# Altium schematic symbol library TI Amplifiers and Linear Special Function Amplifier.SchLib: 708 symbols (part 32 of 34) (continued)
## TPA6101A2DGKRG4
designator U?
50-mW Ultra Low-Voltage, Stereo Headphone Audio Amplifier with Fixed Gain (2 dB), -40 to 85 degC, 8-pin SOP (DGK8), Green (RoHS & no Sb/Br); Manufacturer: Texas Instruments; PartNumber: TPA6101A2DGKRG4; Half Power THD + N @ 1 kHz (%)(kHz): 0.1; ISD(uA): 0.05; Load(Min)(ohms): 16; PSRR(dB): 72; SubFamily: Headphone Amplifier; Supply Max(Max)(Volt): 3.6; Supply Min(Min)(Volt): 1.6; DatasheetVersion: SLOS331C; PackageVersion: 4073329/E, 05/2006; PackageReference: DGK8; PackageDescription: 8-Pin Thin Small Outline, Body 3 x 3 mm, Pitch 0.65 mm; Supplier 1: Digi-Key; Supplier Part Number 1: TPA6101A2DGKRG4-ND; Supplier 2: Mouser; Supplier Part Number 2: 595-TPA6101A2DGKRG4; Eco-Plan: Green (RoHS & no Sb/Br); Headphone Channels: Stereo; Output Power(W): 0.05; Special Features: Fixed Gain; Mounting Technology: Surface Mount; Code_JEDEC: MO-187; ComponentLink1Description: Manufacturer URL; ComponentLink1URL: http://www.ti.com/; ComponentLink2Description: Datasheet; ComponentLink2URL: http://www.ti.com/general/docs/lit/getliterature.tsp?genericPartNumber=TPA6101A2&fileType=pdf; ComponentLink3Description: Package Specification; ComponentLink3URL: http://www.ti.com/litv/pdf/mpds028d
footprint TI-DGK8_N (SOP, 8-Leads, Body 3.1x3.1mm, Pitch 0.65mm, IPC Medium Density)
footprint TI-DGK8_L (SOP, 8-Leads, Body 3.1x3.1mm, Pitch 0.65mm, IPC High Density)
footprint TI-DGK8_M (SOP, 8-Leads, Body 3.1x3.1mm, Pitch 0.65mm, IPC Low Density)
pins: 1 BYPASS "Tap to voltage divider for internal mid-supply bias supply. BYPASS is set at VDD/4. Connect to a 0.1-uF to 1-uF low ESR capacitor for best performance.", 2 GND (power) "GND is the ground connection.", 3 ~{SHUTDOWN} (in) "Active-low input. When held low, the device is placed in a low supply current mode.", 4 IN2- (in) "IN2- is the inverting input for channel 2.", 5 VO2 (out) "VO2 is the audio output for channel 2.", 6 VDD (power) "VDD is the supply voltage terminal.", 7 VO1 (out) "VO1 is the audio output for channel 1.", 8 IN1- (in) "IN1- is the inverting input for channel 1."

## TPA6101A2ZQYR
designator U?
50-mW Ultra Low-Voltage, Stereo Headphone Audio Amplifier with Fixed Gain (2 dB), -40 to 85 degC, 15-pin BGA (ZQY15), Green (RoHS & no Sb/Br); Manufacturer: Texas Instruments; PartNumber: TPA6101A2ZQYR; Half Power THD + N @ 1 kHz (%)(kHz): 0.1; ISD(uA): 0.05; Load(Min)(ohms): 16; PSRR(dB): 72; SubFamily: Headphone Amplifier; Supply Max(Max)(Volt): 3.6; Supply Min(Min)(Volt): 1.6; DatasheetVersion: SLOS331C; PackageVersion: 4205130/A, 05/2003; PackageReference: ZQY15; PackageDescription: 15-Ball Plastic Grid Array, Body 2.5 x 2.5 mm, Pitch 0.5 mm; Supplier 1: Digi-Key; Supplier Part Number 1: 296-21674-2-ND; Supplier 2: Digi-Key; Supplier Part Number 2: 296-21674-1-ND; Supplier 3: Mouser; Supplier Part Number 3: 595-TPA6101A2ZQYR; Eco-Plan: Green (RoHS & no Sb/Br); Headphone Channels: Stereo; Output Power(W): 0.05; Special Features: Fixed Gain; Mounting Technology: Surface Mount; Code_JEDEC: MO-225; ComponentLink1Description: Manufacturer URL; ComponentLink1URL: http://www.ti.com/; ComponentLink2Description: Datasheet; ComponentLink2URL: http://www.ti.com/general/docs/lit/getliterature.tsp?genericPartNumber=TPA6101A2&fileType=pdf; ComponentLink3Description: Package Specification; ComponentLink3URL: http://www.ti.com/litv/pdf/mpbg361
footprint TI-ZQY15 (BGA, 15-Balls, Body 2.5x2.5mm, Pitch 0.5mm)
part A pins: A1 BYPASS "Tap to voltage divider for internal mid-supply bias supply. BYPASS is set at VDD/4. Connect to a 0.1-uF to 1-uF low-ESR capacitor for best performance.", A4 IN1- (in) "IN1- is the inverting input for channel 1.", B4 VO1 (out) "VO1 is the audio output for channel 1.", C1 ~{SHUTDOWN} (in) "Active-low input. When held low, the device is placed in a low-supply-current mode.", D1 IN2- (in) "IN2- is the inverting input for channel 2.", D4 VO2 (out) "VO2 is the audio output for channel 2."
part B pins: A2 GND (power) "GND is the ground connection.", A3 GND (power) "GND is the ground connection.", B1 GND (power) "GND is the ground connection.", B3 GND (power) "GND is the ground connection.", C2 GND (power) "GND is the ground connection.", C3 GND (power) "GND is the ground connection.", C4 VDD (power) "VDD is the supply voltage terminal.", D2 GND (power) "GND is the ground connection.", D3 GND (power) "GND is the ground connection."

## TPA6101A2ZQYRG1
designator U?
50-mW Ultra Low-Voltage, Stereo Headphone Audio Amplifier with Fixed Gain (2 dB), -40 to 85 degC, 15-pin BGA (ZQY15), Green (RoHS & no Sb/Br); Manufacturer: Texas Instruments; PartNumber: TPA6101A2ZQYRG1; Half Power THD + N @ 1 kHz (%)(kHz): 0.1; ISD(uA): 0.05; Load(Min)(ohms): 16; PSRR(dB): 72; SubFamily: Headphone Amplifier; Supply Max(Max)(Volt): 3.6; Supply Min(Min)(Volt): 1.6; DatasheetVersion: SLOS331C; PackageVersion: 4205130/A, 05/2003; PackageReference: ZQY15; PackageDescription: 15-Ball Plastic Grid Array, Body 2.5 x 2.5 mm, Pitch 0.5 mm; Supplier 1: Digi-Key; Supplier Part Number 1: TPA6101A2ZQYRG1-ND; Supplier 2: Mouser; Supplier Part Number 2: 595-TPA6101A2ZQYRG1; Eco-Plan: Green (RoHS & no Sb/Br); Headphone Channels: Stereo; Output Power(W): 0.05; Special Features: Fixed Gain; Mounting Technology: Surface Mount; Code_JEDEC: MO-225; ComponentLink1Description: Manufacturer URL; ComponentLink1URL: http://www.ti.com/; ComponentLink2Description: Datasheet; ComponentLink2URL: http://www.ti.com/general/docs/lit/getliterature.tsp?genericPartNumber=TPA6101A2&fileType=pdf; ComponentLink3Description: Package Specification; ComponentLink3URL: http://www.ti.com/litv/pdf/mpbg361
footprint TI-ZQY15 (BGA, 15-Balls, Body 2.5x2.5mm, Pitch 0.5mm)
part A pins: A1 BYPASS "Tap to voltage divider for internal mid-supply bias supply. BYPASS is set at VDD/4. Connect to a 0.1-uF to 1-uF low-ESR capacitor for best performance.", A4 IN1- (in) "IN1- is the inverting input for channel 1.", B4 VO1 (out) "VO1 is the audio output for channel 1.", C1 ~{SHUTDOWN} (in) "Active-low input. When held low, the device is placed in a low-supply-current mode.", D1 IN2- (in) "IN2- is the inverting input for channel 2.", D4 VO2 (out) "VO2 is the audio output for channel 2."
part B pins: A2 GND (power) "GND is the ground connection.", A3 GND (power) "GND is the ground connection.", B1 GND (power) "GND is the ground connection.", B3 GND (power) "GND is the ground connection.", C2 GND (power) "GND is the ground connection.", C3 GND (power) "GND is the ground connection.", C4 VDD (power) "VDD is the supply voltage terminal.", D2 GND (power) "GND is the ground connection.", D3 GND (power) "GND is the ground connection."

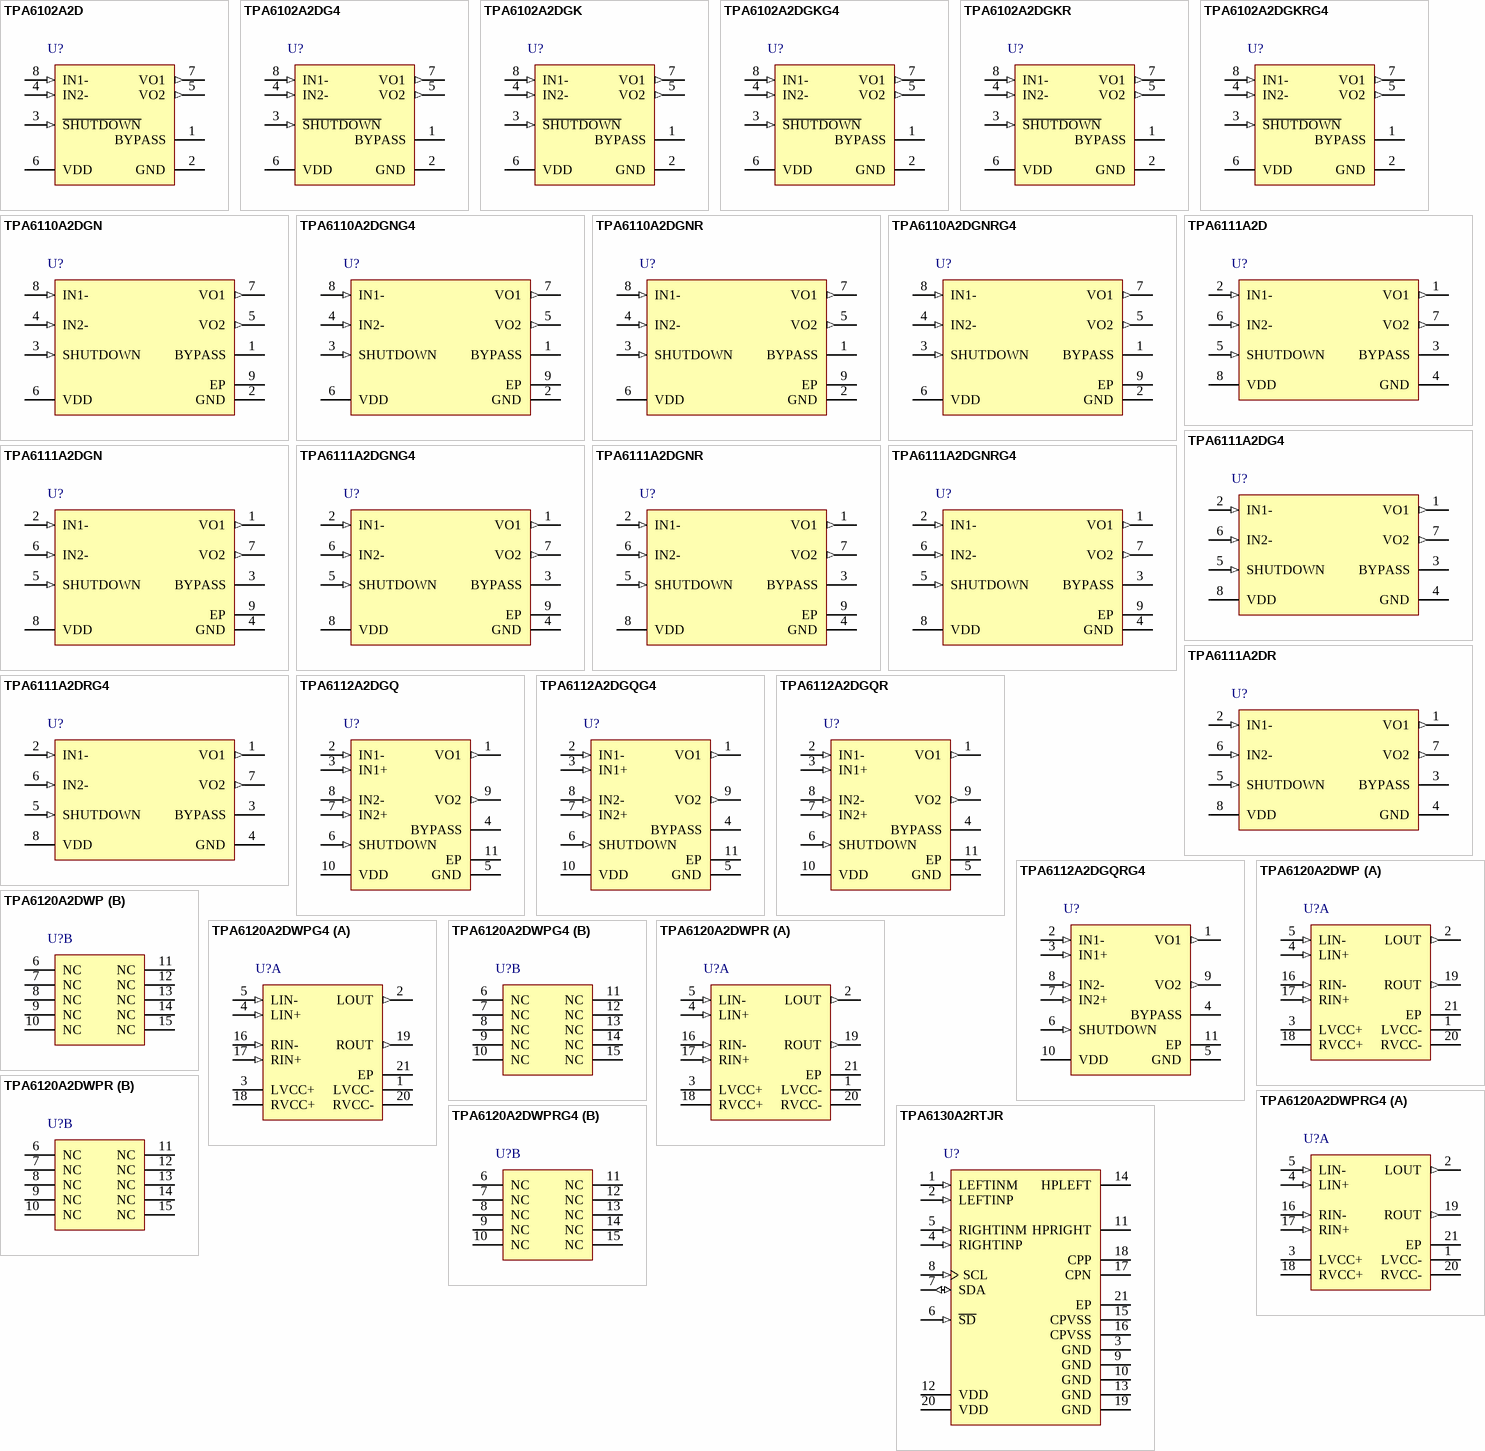
[diagram p37: symbols TPA6102A2D to TPA6130A2RTJR]

## TPA6102A2D
designator U?
50-mW Ultra Low-Voltage, Stereo Headphone Audio Amplifier with Fixed Gain (14 dB), -40 to 85 degC, 8-pin SOIC (D8), Green (RoHS & no Sb/Br); Manufacturer: Texas Instruments; PartNumber: TPA6102A2D; ISD(uA): 0.05; Load(Min)(ohms): 16; PSRR(dB): 72; SubFamily: Headphone Amplifier; Supply Max(Max)(Volt): 3.6; Supply Min(Min)(Volt): 1.6; DatasheetVersion: SLOS324B; PackageVersion: 4040047-3/M, 06/2011; PackageReference: D8; PackageDescription: 8-Pin Plastic Small Outline, Body 4.9 x 3.9 mm, Pitch 1.27 mm; Supplier 1: Digi-Key; Supplier Part Number 1: 296-7020-5-ND; Supplier 2: Mouser; Supplier Part Number 2: 595-TPA6102A2D; Eco-Plan: Green (RoHS & no Sb/Br); Headphone Channels: Stereo; Output Power(W): 0.05; Mounting Technology: Surface Mount; Code_JEDEC: MS-012; ComponentLink1Description: Manufacturer URL; ComponentLink1URL: http://www.ti.com/; ComponentLink2Description: Datasheet; ComponentLink2URL: http://www.ti.com/general/docs/lit/getliterature.tsp?genericPartNumber=TPA6102A2&fileType=pdf; ComponentLink3Description: Package Specification; ComponentLink3URL: http://www.ti.com/litv/pdf/msoi002j
footprint TI-D8_N (SOIC, 8-Leads, Body 5x4mm, Pitch 1.27mm, IPC Medium Density)
footprint TI-D8_L (SOIC, 8-Leads, Body 5x4mm, Pitch 1.27mm, IPC High Density)
footprint TI-D8_M (SOIC, 8-Leads, Body 5x4mm, Pitch 1.27mm, IPC Low Density)
pins: 1 BYPASS "Tap to voltage divider for internal mid-supply bias supply. BYPASS is set at VDD/4. Connect to a 0.1-uF to 1-uF low ESR capacitor for best performance.", 2 GND (power) "GND is the ground connection.", 3 ~{SHUTDOWN} (in) "Active-low input. When held low, the device is placed in a low supply current mode.", 4 IN2- (in) "IN2- is the inverting input for channel 2.", 5 VO2 (out) "VO2 is the audio output for channel 2.", 6 VDD (power) "VDD is the supply voltage terminal.", 7 VO1 (out) "VO1 is the audio output for channel 1.", 8 IN1- (in) "IN1- is the inverting input for channel 1."

## TPA6102A2DG4
designator U?
50-mW Ultra Low-Voltage, Stereo Headphone Audio Amplifier with Fixed Gain (14 dB), -40 to 85 degC, 8-pin SOIC (D8), Green (RoHS & no Sb/Br); Manufacturer: Texas Instruments; PartNumber: TPA6102A2DG4; ISD(uA): 0.05; Load(Min)(ohms): 16; PSRR(dB): 72; SubFamily: Headphone Amplifier; Supply Max(Max)(Volt): 3.6; Supply Min(Min)(Volt): 1.6; DatasheetVersion: SLOS324B; PackageVersion: 4040047-3/M, 06/2011; PackageReference: D8; PackageDescription: 8-Pin Plastic Small Outline, Body 4.9 x 3.9 mm, Pitch 1.27 mm; Supplier 1: Digi-Key; Supplier Part Number 1: TPA6102A2DG4-ND; Supplier 2: Mouser; Supplier Part Number 2: 595-TPA6102A2DG4; Eco-Plan: Green (RoHS & no Sb/Br); Headphone Channels: Stereo; Output Power(W): 0.05; Mounting Technology: Surface Mount; Code_JEDEC: MS-012; ComponentLink1Description: Manufacturer URL; ComponentLink1URL: http://www.ti.com/; ComponentLink2Description: Datasheet; ComponentLink2URL: http://www.ti.com/general/docs/lit/getliterature.tsp?genericPartNumber=TPA6102A2&fileType=pdf; ComponentLink3Description: Package Specification; ComponentLink3URL: http://www.ti.com/litv/pdf/msoi002j
footprint TI-D8_N (SOIC, 8-Leads, Body 5x4mm, Pitch 1.27mm, IPC Medium Density)
footprint TI-D8_L (SOIC, 8-Leads, Body 5x4mm, Pitch 1.27mm, IPC High Density)
footprint TI-D8_M (SOIC, 8-Leads, Body 5x4mm, Pitch 1.27mm, IPC Low Density)
pins: 1 BYPASS "Tap to voltage divider for internal mid-supply bias supply. BYPASS is set at VDD/4. Connect to a 0.1-uF to 1-uF low ESR capacitor for best performance.", 2 GND (power) "GND is the ground connection.", 3 ~{SHUTDOWN} (in) "Active-low input. When held low, the device is placed in a low supply current mode.", 4 IN2- (in) "IN2- is the inverting input for channel 2.", 5 VO2 (out) "VO2 is the audio output for channel 2.", 6 VDD (power) "VDD is the supply voltage terminal.", 7 VO1 (out) "VO1 is the audio output for channel 1.", 8 IN1- (in) "IN1- is the inverting input for channel 1."

## TPA6102A2DGK
designator U?
50-mW Ultra Low-Voltage, Stereo Headphone Audio Amplifier with Fixed Gain (14 dB), -40 to 85 degC, 8-pin SOP (DGK8), Green (RoHS & no Sb/Br); Manufacturer: Texas Instruments; PartNumber: TPA6102A2DGK; ISD(uA): 0.05; Load(Min)(ohms): 16; PSRR(dB): 72; SubFamily: Headphone Amplifier; Supply Max(Max)(Volt): 3.6; Supply Min(Min)(Volt): 1.6; DatasheetVersion: SLOS324B; PackageVersion: 4073329/E, 05/2006; PackageReference: DGK8; PackageDescription: 8-Pin Thin Small Outline, Body 3 x 3 mm, Pitch 0.65 mm; Supplier 1: Digi-Key; Supplier Part Number 1: TPA6102A2DGK-ND; Supplier 2: Mouser; Supplier Part Number 2: 595-TPA6102A2DGK; Eco-Plan: Green (RoHS & no Sb/Br); Headphone Channels: Stereo; Output Power(W): 0.05; Mounting Technology: Surface Mount; Code_JEDEC: MO-187; ComponentLink1Description: Manufacturer URL; ComponentLink1URL: http://www.ti.com/; ComponentLink2Description: Datasheet; ComponentLink2URL: http://www.ti.com/general/docs/lit/getliterature.tsp?genericPartNumber=TPA6102A2&fileType=pdf; ComponentLink3Description: Package Specification; ComponentLink3URL: http://www.ti.com/litv/pdf/mpds028d
footprint TI-DGK8_N (SOP, 8-Leads, Body 3.1x3.1mm, Pitch 0.65mm, IPC Medium Density)
footprint TI-DGK8_L (SOP, 8-Leads, Body 3.1x3.1mm, Pitch 0.65mm, IPC High Density)
footprint TI-DGK8_M (SOP, 8-Leads, Body 3.1x3.1mm, Pitch 0.65mm, IPC Low Density)
pins: 1 BYPASS "Tap to voltage divider for internal mid-supply bias supply. BYPASS is set at VDD/4. Connect to a 0.1-uF to 1-uF low ESR capacitor for best performance.", 2 GND (power) "GND is the ground connection.", 3 ~{SHUTDOWN} (in) "Active-low input. When held low, the device is placed in a low supply current mode.", 4 IN2- (in) "IN2- is the inverting input for channel 2.", 5 VO2 (out) "VO2 is the audio output for channel 2.", 6 VDD (power) "VDD is the supply voltage terminal.", 7 VO1 (out) "VO1 is the audio output for channel 1.", 8 IN1- (in) "IN1- is the inverting input for channel 1."

## TPA6102A2DGKG4
designator U?
50-mW Ultra Low-Voltage, Stereo Headphone Audio Amplifier with Fixed Gain (14 dB), -40 to 85 degC, 8-pin SOP (DGK8), Green (RoHS & no Sb/Br); Manufacturer: Texas Instruments; PartNumber: TPA6102A2DGKG4; ISD(uA): 0.05; Load(Min)(ohms): 16; PSRR(dB): 72; SubFamily: Headphone Amplifier; Supply Max(Max)(Volt): 3.6; Supply Min(Min)(Volt): 1.6; DatasheetVersion: SLOS324B; PackageVersion: 4073329/E, 05/2006; PackageReference: DGK8; PackageDescription: 8-Pin Thin Small Outline, Body 3 x 3 mm, Pitch 0.65 mm; Supplier 1: Digi-Key; Supplier Part Number 1: TPA6102A2DGKG4-ND; Supplier 2: Mouser; Supplier Part Number 2: 595-TPA6102A2DGKG4; Eco-Plan: Green (RoHS & no Sb/Br); Headphone Channels: Stereo; Output Power(W): 0.05; Mounting Technology: Surface Mount; Code_JEDEC: MO-187; ComponentLink1Description: Manufacturer URL; ComponentLink1URL: http://www.ti.com/; ComponentLink2Description: Datasheet; ComponentLink2URL: http://www.ti.com/general/docs/lit/getliterature.tsp?genericPartNumber=TPA6102A2&fileType=pdf; ComponentLink3Description: Package Specification; ComponentLink3URL: http://www.ti.com/litv/pdf/mpds028d
footprint TI-DGK8_N (SOP, 8-Leads, Body 3.1x3.1mm, Pitch 0.65mm, IPC Medium Density)
footprint TI-DGK8_L (SOP, 8-Leads, Body 3.1x3.1mm, Pitch 0.65mm, IPC High Density)
footprint TI-DGK8_M (SOP, 8-Leads, Body 3.1x3.1mm, Pitch 0.65mm, IPC Low Density)
pins: 1 BYPASS "Tap to voltage divider for internal mid-supply bias supply. BYPASS is set at VDD/4. Connect to a 0.1-uF to 1-uF low ESR capacitor for best performance.", 2 GND (power) "GND is the ground connection.", 3 ~{SHUTDOWN} (in) "Active-low input. When held low, the device is placed in a low supply current mode.", 4 IN2- (in) "IN2- is the inverting input for channel 2.", 5 VO2 (out) "VO2 is the audio output for channel 2.", 6 VDD (power) "VDD is the supply voltage terminal.", 7 VO1 (out) "VO1 is the audio output for channel 1.", 8 IN1- (in) "IN1- is the inverting input for channel 1."

## TPA6102A2DGKR
designator U?
50-mW Ultra Low-Voltage, Stereo Headphone Audio Amplifier with Fixed Gain (14 dB), -40 to 85 degC, 8-pin SOP (DGK8), Green (RoHS & no Sb/Br); Manufacturer: Texas Instruments; PartNumber: TPA6102A2DGKR; ISD(uA): 0.05; Load(Min)(ohms): 16; PSRR(dB): 72; SubFamily: Headphone Amplifier; Supply Max(Max)(Volt): 3.6; Supply Min(Min)(Volt): 1.6; DatasheetVersion: SLOS324B; PackageVersion: 4073329/E, 05/2006; PackageReference: DGK8; PackageDescription: 8-Pin Thin Small Outline, Body 3 x 3 mm, Pitch 0.65 mm; Supplier 1: Digi-Key; Supplier Part Number 1: 296-7021-2-ND; Supplier 2: Digi-Key; Supplier Part Number 2: 296-7021-1-ND; Supplier 3: Digi-Key; Supplier Part Number 3: 296-7021-6-ND; Supplier 4: Mouser; Supplier Part Number 4: 595-TPA6102A2DGKR; Eco-Plan: Green (RoHS & no Sb/Br); Headphone Channels: Stereo; Output Power(W): 0.05; Mounting Technology: Surface Mount; Code_JEDEC: MO-187; ComponentLink1Description: Manufacturer URL; ComponentLink1URL: http://www.ti.com/; ComponentLink2Description: Datasheet; ComponentLink2URL: http://www.ti.com/general/docs/lit/getliterature.tsp?genericPartNumber=TPA6102A2&fileType=pdf; ComponentLink3Description: Package Specification; ComponentLink3URL: http://www.ti.com/litv/pdf/mpds028d
footprint TI-DGK8_N (SOP, 8-Leads, Body 3.1x3.1mm, Pitch 0.65mm, IPC Medium Density)
footprint TI-DGK8_L (SOP, 8-Leads, Body 3.1x3.1mm, Pitch 0.65mm, IPC High Density)
footprint TI-DGK8_M (SOP, 8-Leads, Body 3.1x3.1mm, Pitch 0.65mm, IPC Low Density)
pins: 1 BYPASS "Tap to voltage divider for internal mid-supply bias supply. BYPASS is set at VDD/4. Connect to a 0.1-uF to 1-uF low ESR capacitor for best performance.", 2 GND (power) "GND is the ground connection.", 3 ~{SHUTDOWN} (in) "Active-low input. When held low, the device is placed in a low supply current mode.", 4 IN2- (in) "IN2- is the inverting input for channel 2.", 5 VO2 (out) "VO2 is the audio output for channel 2.", 6 VDD (power) "VDD is the supply voltage terminal.", 7 VO1 (out) "VO1 is the audio output for channel 1.", 8 IN1- (in) "IN1- is the inverting input for channel 1."

## TPA6102A2DGKRG4
designator U?
50-mW Ultra Low-Voltage, Stereo Headphone Audio Amplifier with Fixed Gain (14 dB), -40 to 85 degC, 8-pin SOP (DGK8), Green (RoHS & no Sb/Br); Manufacturer: Texas Instruments; PartNumber: TPA6102A2DGKRG4; ISD(uA): 0.05; Load(Min)(ohms): 16; PSRR(dB): 72; SubFamily: Headphone Amplifier; Supply Max(Max)(Volt): 3.6; Supply Min(Min)(Volt): 1.6; DatasheetVersion: SLOS324B; PackageVersion: 4073329/E, 05/2006; PackageReference: DGK8; PackageDescription: 8-Pin Thin Small Outline, Body 3 x 3 mm, Pitch 0.65 mm; Supplier 1: Digi-Key; Supplier Part Number 1: TPA6102A2DGKRG4-ND; Supplier 2: Newark; Supplier Part Number 2: 54K1502; Supplier 3: Mouser; Supplier Part Number 3: 595-TPA6102A2DGKRG4; Eco-Plan: Green (RoHS & no Sb/Br); Headphone Channels: Stereo; Output Power(W): 0.05; Mounting Technology: Surface Mount; Code_JEDEC: MO-187; ComponentLink1Description: Manufacturer URL; ComponentLink1URL: http://www.ti.com/; ComponentLink2Description: Datasheet; ComponentLink2URL: http://www.ti.com/general/docs/lit/getliterature.tsp?genericPartNumber=TPA6102A2&fileType=pdf; ComponentLink3Description: Package Specification; ComponentLink3URL: http://www.ti.com/litv/pdf/mpds028d
footprint TI-DGK8_N (SOP, 8-Leads, Body 3.1x3.1mm, Pitch 0.65mm, IPC Medium Density)
footprint TI-DGK8_L (SOP, 8-Leads, Body 3.1x3.1mm, Pitch 0.65mm, IPC High Density)
footprint TI-DGK8_M (SOP, 8-Leads, Body 3.1x3.1mm, Pitch 0.65mm, IPC Low Density)
pins: 1 BYPASS "Tap to voltage divider for internal mid-supply bias supply. BYPASS is set at VDD/4. Connect to a 0.1-uF to 1-uF low ESR capacitor for best performance.", 2 GND (power) "GND is the ground connection.", 3 ~{SHUTDOWN} (in) "Active-low input. When held low, the device is placed in a low supply current mode.", 4 IN2- (in) "IN2- is the inverting input for channel 2.", 5 VO2 (out) "VO2 is the audio output for channel 2.", 6 VDD (power) "VDD is the supply voltage terminal.", 7 VO1 (out) "VO1 is the audio output for channel 1.", 8 IN1- (in) "IN1- is the inverting input for channel 1."

## TPA6110A2DGN
designator U?
150-mW Stereo Headphone Audio Amplifier, Pin Compatible with LM4881, -40 to 85 degC, 8-pin SOP (DGN8), Green (RoHS & no Sb/Br); Manufacturer: Texas Instruments; PartNumber: TPA6110A2DGN; ISD(uA): 1; Load(Min)(ohms): 16; Output Power(W): 0.15; PSRR(dB): 83; SubFamily: Headphone Amplifier; Supply Max(Max)(Volt): 5.5; Supply Min(Min)(Volt): 2.5; DatasheetVersion: SLOS314B; PackageVersion: 4073271/F, 05/2011; PackageReference: DGN8-1760X1425TP; PackageDescription: 8-Pin Plastic Small Outline, Body 3 x 3 mm, Pitch 0.65 mm; Supplier 1: Digi-Key; Supplier Part Number 1: 296-10843-5-ND; Supplier 2: Newark; Supplier Part Number 2: 76C9841; Supplier 3: Mouser; Supplier Part Number 3: 595-TPA6110A2DGN; Eco-Plan: Green (RoHS & no Sb/Br); Headphone Channels: Stereo; Mounting Technology: Surface Mount; Code_JEDEC: MO-187; ComponentLink1Description: Manufacturer URL; ComponentLink1URL: http://www.ti.com/; ComponentLink2Description: Datasheet; ComponentLink2URL: http://www.ti.com/general/docs/lit/getliterature.tsp?genericPartNumber=TPA6110A2&fileType=pdf; ComponentLink3Description: Package Specification; ComponentLink3URL: http://www.ti.com/litv/pdf/mpds046e
footprint TI-DGN8-1760X1425TP_N (SOP, 8-Leads, Body 3.1x3.1mm, Pitch 0.65mm, Thermal Pad 1.89x1.57mm, IPC Medium Density)
footprint TI-DGN8-1760X1425TP_L (SOP, 8-Leads, Body 3.1x3.1mm, Pitch 0.65mm, Thermal Pad 1.89x1.57mm, IPC High Density)
footprint TI-DGN8-1760X1425TP_M (SOP, 8-Leads, Body 3.1x3.1mm, Pitch 0.65mm, Thermal Pad 1.89x1.57mm, IPC Low Density)
pins: 1 BYPASS "Tap to voltage divider for internal mid-supply bias supply. Connect to a 0.1 uF to 1 uF low ESR capacitor for best performance.", 2 GND (power) "GND is the ground connection.", 3 SHUTDOWN (in) "Puts the device in a low quiescent current mode when held high.", 4 IN2- (in) "IN2- is the inverting input for channel 2.", 5 VO2 (out) "VO2 is the audio output for channel 2.", 6 VDD (power) "VDD is the supply voltage terminal.", 7 VO1 (out) "VO1 is the audio output for channel 1.", 8 IN1- (in) "IN1- is the inverting input for channel 1.", 9 EP

## TPA6110A2DGNG4
designator U?
150-mW Stereo Headphone Audio Amplifier, Pin Compatible with LM4881, -40 to 85 degC, 8-pin SOP (DGN8), Green (RoHS & no Sb/Br); Manufacturer: Texas Instruments; PartNumber: TPA6110A2DGNG4; ISD(uA): 1; Load(Min)(ohms): 16; Output Power(W): 0.15; PSRR(dB): 83; SubFamily: Headphone Amplifier; Supply Max(Max)(Volt): 5.5; Supply Min(Min)(Volt): 2.5; DatasheetVersion: SLOS314B; PackageVersion: 4073271/F, 05/2011; PackageReference: DGN8-1760X1425TP; PackageDescription: 8-Pin Plastic Small Outline, Body 3 x 3 mm, Pitch 0.65 mm; Supplier 1: Digi-Key; Supplier Part Number 1: TPA6110A2DGNG4-ND; Supplier 2: Newark; Supplier Part Number 2: 58K6879; Supplier 3: Mouser; Supplier Part Number 3: 595-TPA6110A2DGNG4; Eco-Plan: Green (RoHS & no Sb/Br); Headphone Channels: Stereo; Mounting Technology: Surface Mount; Code_JEDEC: MO-187; ComponentLink1Description: Manufacturer URL; ComponentLink1URL: http://www.ti.com/; ComponentLink2Description: Datasheet; ComponentLink2URL: http://www.ti.com/general/docs/lit/getliterature.tsp?genericPartNumber=TPA6110A2&fileType=pdf; ComponentLink3Description: Package Specification; ComponentLink3URL: http://www.ti.com/litv/pdf/mpds046e
footprint TI-DGN8-1760X1425TP_N (SOP, 8-Leads, Body 3.1x3.1mm, Pitch 0.65mm, Thermal Pad 1.89x1.57mm, IPC Medium Density)
footprint TI-DGN8-1760X1425TP_L (SOP, 8-Leads, Body 3.1x3.1mm, Pitch 0.65mm, Thermal Pad 1.89x1.57mm, IPC High Density)
footprint TI-DGN8-1760X1425TP_M (SOP, 8-Leads, Body 3.1x3.1mm, Pitch 0.65mm, Thermal Pad 1.89x1.57mm, IPC Low Density)
pins: 1 BYPASS "Tap to voltage divider for internal mid-supply bias supply. Connect to a 0.1 uF to 1 uF low ESR capacitor for best performance.", 2 GND (power) "GND is the ground connection.", 3 SHUTDOWN (in) "Puts the device in a low quiescent current mode when held high.", 4 IN2- (in) "IN2- is the inverting input for channel 2.", 5 VO2 (out) "VO2 is the audio output for channel 2.", 6 VDD (power) "VDD is the supply voltage terminal.", 7 VO1 (out) "VO1 is the audio output for channel 1.", 8 IN1- (in) "IN1- is the inverting input for channel 1.", 9 EP

## TPA6110A2DGNR
designator U?
150-mW Stereo Headphone Audio Amplifier, Pin Compatible with LM4881, -40 to 85 degC, 8-pin SOP (DGN8), Green (RoHS & no Sb/Br); Manufacturer: Texas Instruments; PartNumber: TPA6110A2DGNR; ISD(uA): 1; Load(Min)(ohms): 16; Output Power(W): 0.15; PSRR(dB): 83; SubFamily: Headphone Amplifier; Supply Max(Max)(Volt): 5.5; Supply Min(Min)(Volt): 2.5; DatasheetVersion: SLOS314B; PackageVersion: 4073271/F, 05/2011; PackageReference: DGN8-1760X1425TP; PackageDescription: 8-Pin Plastic Small Outline, Body 3 x 3 mm, Pitch 0.65 mm; Supplier 1: Digi-Key; Supplier Part Number 1: 296-31976-2-ND; Supplier 2: Digi-Key; Supplier Part Number 2: 296-31976-1-ND; Supplier 3: Digi-Key; Supplier Part Number 3: 296-31976-6-ND; Supplier 4: Newark; Supplier Part Number 4: 76C9842; Supplier 5: Mouser; Supplier Part Number 5: 595-TPA6110A2DGNR; Eco-Plan: Green (RoHS & no Sb/Br); Headphone Channels: Stereo; Mounting Technology: Surface Mount; Code_JEDEC: MO-187; ComponentLink1Description: Manufacturer URL; ComponentLink1URL: http://www.ti.com/; ComponentLink2Description: Datasheet; ComponentLink2URL: http://www.ti.com/general/docs/lit/getliterature.tsp?genericPartNumber=TPA6110A2&fileType=pdf; ComponentLink3Description: Package Specification; ComponentLink3URL: http://www.ti.com/litv/pdf/mpds046e
footprint TI-DGN8-1760X1425TP_N (SOP, 8-Leads, Body 3.1x3.1mm, Pitch 0.65mm, Thermal Pad 1.89x1.57mm, IPC Medium Density)
footprint TI-DGN8-1760X1425TP_L (SOP, 8-Leads, Body 3.1x3.1mm, Pitch 0.65mm, Thermal Pad 1.89x1.57mm, IPC High Density)
footprint TI-DGN8-1760X1425TP_M (SOP, 8-Leads, Body 3.1x3.1mm, Pitch 0.65mm, Thermal Pad 1.89x1.57mm, IPC Low Density)
pins: 1 BYPASS "Tap to voltage divider for internal mid-supply bias supply. Connect to a 0.1 uF to 1 uF low ESR capacitor for best performance.", 2 GND (power) "GND is the ground connection.", 3 SHUTDOWN (in) "Puts the device in a low quiescent current mode when held high.", 4 IN2- (in) "IN2- is the inverting input for channel 2.", 5 VO2 (out) "VO2 is the audio output for channel 2.", 6 VDD (power) "VDD is the supply voltage terminal.", 7 VO1 (out) "VO1 is the audio output for channel 1.", 8 IN1- (in) "IN1- is the inverting input for channel 1.", 9 EP

## TPA6110A2DGNRG4
designator U?
150-mW Stereo Headphone Audio Amplifier, Pin Compatible with LM4881, -40 to 85 degC, 8-pin SOP (DGN8), Green (RoHS & no Sb/Br); Manufacturer: Texas Instruments; PartNumber: TPA6110A2DGNRG4; ISD(uA): 1; Load(Min)(ohms): 16; Output Power(W): 0.15; PSRR(dB): 83; SubFamily: Headphone Amplifier; Supply Max(Max)(Volt): 5.5; Supply Min(Min)(Volt): 2.5; DatasheetVersion: SLOS314B; PackageVersion: 4073271/F, 05/2011; PackageReference: DGN8-1760X1425TP; PackageDescription: 8-Pin Plastic Small Outline, Body 3 x 3 mm, Pitch 0.65 mm; Supplier 1: Digi-Key; Supplier Part Number 1: TPA6110A2DGNRG4-ND; Supplier 2: Newark; Supplier Part Number 2: 24K5790; Supplier 3: Mouser; Supplier Part Number 3: 595-TPA6110A2DGNRG4; Eco-Plan: Green (RoHS & no Sb/Br); Headphone Channels: Stereo; Mounting Technology: Surface Mount; Code_JEDEC: MO-187; ComponentLink1Description: Manufacturer URL; ComponentLink1URL: http://www.ti.com/; ComponentLink2Description: Datasheet; ComponentLink2URL: http://www.ti.com/general/docs/lit/getliterature.tsp?genericPartNumber=TPA6110A2&fileType=pdf; ComponentLink3Description: Package Specification; ComponentLink3URL: http://www.ti.com/litv/pdf/mpds046e
footprint TI-DGN8-1760X1425TP_N (SOP, 8-Leads, Body 3.1x3.1mm, Pitch 0.65mm, Thermal Pad 1.89x1.57mm, IPC Medium Density)
footprint TI-DGN8-1760X1425TP_L (SOP, 8-Leads, Body 3.1x3.1mm, Pitch 0.65mm, Thermal Pad 1.89x1.57mm, IPC High Density)
footprint TI-DGN8-1760X1425TP_M (SOP, 8-Leads, Body 3.1x3.1mm, Pitch 0.65mm, Thermal Pad 1.89x1.57mm, IPC Low Density)
pins: 1 BYPASS "Tap to voltage divider for internal mid-supply bias supply. Connect to a 0.1 uF to 1 uF low ESR capacitor for best performance.", 2 GND (power) "GND is the ground connection.", 3 SHUTDOWN (in) "Puts the device in a low quiescent current mode when held high.", 4 IN2- (in) "IN2- is the inverting input for channel 2.", 5 VO2 (out) "VO2 is the audio output for channel 2.", 6 VDD (power) "VDD is the supply voltage terminal.", 7 VO1 (out) "VO1 is the audio output for channel 1.", 8 IN1- (in) "IN1- is the inverting input for channel 1.", 9 EP

## TPA6111A2D
designator U?
150-mW Stereo Headphone Audio Amplifier, Pin Compatible with LM4880 and LM4881, -40 to 85 degC, 8-pin SOIC (D8), Green (RoHS & no Sb/Br); Manufacturer: Texas Instruments; PartNumber: TPA6111A2D; ISD(uA): 1; Load(Min)(ohms): 16; Output Power(W): 0.15; PSRR(dB): 70; SubFamily: Headphone Amplifier; Supply Max(Max)(Volt): 5.5; Supply Min(Min)(Volt): 2.5; DatasheetVersion: SLOS313B; PackageVersion: 4040047-3/M, 06/2011; PackageReference: D8; PackageDescription: 8-Pin Plastic Small Outline, Body 4.9 x 3.9 mm, Pitch 1.27 mm; Supplier 1: Digi-Key; Supplier Part Number 1: 296-26887-5-ND; Supplier 2: Farnell; Supplier Part Number 2: 8456593; Supplier 3: Newark; Supplier Part Number 3: 38K8607; Supplier 4: Newark; Supplier Part Number 4: 76C9844; Supplier 5: Mouser; Supplier Part Number 5: 595-TPA6111A2D; Eco-Plan: Green (RoHS & no Sb/Br); Headphone Channels: Stereo; Mounting Technology: Surface Mount; Code_JEDEC: MS-012; ComponentLink1Description: Manufacturer URL; ComponentLink1URL: http://www.ti.com/; ComponentLink2Description: Datasheet; ComponentLink2URL: http://www.ti.com/general/docs/lit/getliterature.tsp?genericPartNumber=TPA6111A2&fileType=pdf; ComponentLink3Description: Package Specification; ComponentLink3URL: http://www.ti.com/litv/pdf/msoi002j
footprint TI-D8_N (SOIC, 8-Leads, Body 5x4mm, Pitch 1.27mm, IPC Medium Density)
footprint TI-D8_L (SOIC, 8-Leads, Body 5x4mm, Pitch 1.27mm, IPC High Density)
footprint TI-D8_M (SOIC, 8-Leads, Body 5x4mm, Pitch 1.27mm, IPC Low Density)
pins: 1 VO1 (out) "VO1 is the audio output for channel 1.", 2 IN1- (in) "IN1- is the inverting input for channel 1.", 3 BYPASS "Tap to voltage divider for internal mid-supply bias supply. Connect to a 0.1 uF to 1 uF low ESR capacitor for best performance.", 4 GND (power) "GND is the ground connection.", 5 SHUTDOWN (in) "Puts the device in a low quiescent current mode when held high", 6 IN2- (in) "IN2- is the inverting input for channel 2.", 7 VO2 (out) "VO2 is the audio output for channel 2.", 8 VDD (power) "VDD is the supply voltage terminal."

## TPA6111A2DG4
designator U?
150-mW Stereo Headphone Audio Amplifier, Pin Compatible with LM4880 and LM4881, -40 to 85 degC, 8-pin SOIC (D8), Green (RoHS & no Sb/Br); Manufacturer: Texas Instruments; PartNumber: TPA6111A2DG4; ISD(uA): 1; Load(Min)(ohms): 16; Output Power(W): 0.15; PSRR(dB): 70; SubFamily: Headphone Amplifier; Supply Max(Max)(Volt): 5.5; Supply Min(Min)(Volt): 2.5; DatasheetVersion: SLOS313B; PackageVersion: 4040047-3/M, 06/2011; PackageReference: D8; PackageDescription: 8-Pin Plastic Small Outline, Body 4.9 x 3.9 mm, Pitch 1.27 mm; Supplier 1: Digi-Key; Supplier Part Number 1: TPA6111A2DG4-ND; Supplier 2: Mouser; Supplier Part Number 2: 595-TPA6111A2DG4; Eco-Plan: Green (RoHS & no Sb/Br); Headphone Channels: Stereo; Mounting Technology: Surface Mount; Code_JEDEC: MS-012; ComponentLink1Description: Manufacturer URL; ComponentLink1URL: http://www.ti.com/; ComponentLink2Description: Datasheet; ComponentLink2URL: http://www.ti.com/general/docs/lit/getliterature.tsp?genericPartNumber=TPA6111A2&fileType=pdf; ComponentLink3Description: Package Specification; ComponentLink3URL: http://www.ti.com/litv/pdf/msoi002j
footprint TI-D8_N (SOIC, 8-Leads, Body 5x4mm, Pitch 1.27mm, IPC Medium Density)
footprint TI-D8_L (SOIC, 8-Leads, Body 5x4mm, Pitch 1.27mm, IPC High Density)
footprint TI-D8_M (SOIC, 8-Leads, Body 5x4mm, Pitch 1.27mm, IPC Low Density)
pins: 1 VO1 (out) "VO1 is the audio output for channel 1.", 2 IN1- (in) "IN1- is the inverting input for channel 1.", 3 BYPASS "Tap to voltage divider for internal mid-supply bias supply. Connect to a 0.1 uF to 1 uF low ESR capacitor for best performance.", 4 GND (power) "GND is the ground connection.", 5 SHUTDOWN (in) "Puts the device in a low quiescent current mode when held high", 6 IN2- (in) "IN2- is the inverting input for channel 2.", 7 VO2 (out) "VO2 is the audio output for channel 2.", 8 VDD (power) "VDD is the supply voltage terminal."

## TPA6111A2DGN
designator U?
150-mW Stereo Headphone Audio Amplifier, Pin Compatible with LM4880 and LM4881, -40 to 85 degC, 8-pin SOP (DGN8), Green (RoHS & no Sb/Br); Manufacturer: Texas Instruments; PartNumber: TPA6111A2DGN; ISD(uA): 1; Load(Min)(ohms): 16; Output Power(W): 0.15; PSRR(dB): 70; SubFamily: Headphone Amplifier; Supply Max(Max)(Volt): 5.5; Supply Min(Min)(Volt): 2.5; DatasheetVersion: SLOS313B; PackageVersion: 4073271/F, 05/2011; PackageReference: DGN8-1760X1425TP; PackageDescription: 8-Pin Plastic Small Outline, Body 3 x 3 mm, Pitch 0.65 mm; Supplier 1: Digi-Key; Supplier Part Number 1: 296-10845-5-ND; Supplier 2: Newark; Supplier Part Number 2: 76C9845; Supplier 3: Mouser; Supplier Part Number 3: 595-TPA6111A2DGN; Eco-Plan: Green (RoHS & no Sb/Br); Headphone Channels: Stereo; Mounting Technology: Surface Mount; Code_JEDEC: MO-187; ComponentLink1Description: Manufacturer URL; ComponentLink1URL: http://www.ti.com/; ComponentLink2Description: Datasheet; ComponentLink2URL: http://www.ti.com/general/docs/lit/getliterature.tsp?genericPartNumber=TPA6111A2&fileType=pdf; ComponentLink3Description: Package Specification; ComponentLink3URL: http://www.ti.com/litv/pdf/mpds046e
footprint TI-DGN8-1760X1425TP_N (SOP, 8-Leads, Body 3.1x3.1mm, Pitch 0.65mm, Thermal Pad 1.89x1.57mm, IPC Medium Density)
footprint TI-DGN8-1760X1425TP_L (SOP, 8-Leads, Body 3.1x3.1mm, Pitch 0.65mm, Thermal Pad 1.89x1.57mm, IPC High Density)
footprint TI-DGN8-1760X1425TP_M (SOP, 8-Leads, Body 3.1x3.1mm, Pitch 0.65mm, Thermal Pad 1.89x1.57mm, IPC Low Density)
pins: 1 VO1 (out) "VO1 is the audio output for channel 1.", 2 IN1- (in) "IN1- is the inverting input for channel 1.", 3 BYPASS "Tap to voltage divider for internal mid-supply bias supply. Connect to a 0.1 uF to 1 uF low ESR capacitor for best performance.", 4 GND (power) "GND is the ground connection.", 5 SHUTDOWN (in) "Puts the device in a low quiescent current mode when held high", 6 IN2- (in) "IN2- is the inverting input for channel 2.", 7 VO2 (out) "VO2 is the audio output for channel 2.", 8 VDD (power) "VDD is the supply voltage terminal.", 9 EP

## TPA6111A2DGNG4
designator U?
150-mW Stereo Headphone Audio Amplifier, Pin Compatible with LM4880 and LM4881, -40 to 85 degC, 8-pin SOP (DGN8), Green (RoHS & no Sb/Br); Manufacturer: Texas Instruments; PartNumber: TPA6111A2DGNG4; ISD(uA): 1; Load(Min)(ohms): 16; Output Power(W): 0.15; PSRR(dB): 70; SubFamily: Headphone Amplifier; Supply Max(Max)(Volt): 5.5; Supply Min(Min)(Volt): 2.5; DatasheetVersion: SLOS313B; PackageVersion: 4073271/F, 05/2011; PackageReference: DGN8-1760X1425TP; PackageDescription: 8-Pin Plastic Small Outline, Body 3 x 3 mm, Pitch 0.65 mm; Supplier 1: Digi-Key; Supplier Part Number 1: TPA6111A2DGNG4-ND; Supplier 2: Mouser; Supplier Part Number 2: 595-TPA6111A2DGNG4; Eco-Plan: Green (RoHS & no Sb/Br); Headphone Channels: Stereo; Mounting Technology: Surface Mount; Code_JEDEC: MO-187; ComponentLink1Description: Manufacturer URL; ComponentLink1URL: http://www.ti.com/; ComponentLink2Description: Datasheet; ComponentLink2URL: http://www.ti.com/general/docs/lit/getliterature.tsp?genericPartNumber=TPA6111A2&fileType=pdf; ComponentLink3Description: Package Specification; ComponentLink3URL: http://www.ti.com/litv/pdf/mpds046e
footprint TI-DGN8-1760X1425TP_N (SOP, 8-Leads, Body 3.1x3.1mm, Pitch 0.65mm, Thermal Pad 1.89x1.57mm, IPC Medium Density)
footprint TI-DGN8-1760X1425TP_L (SOP, 8-Leads, Body 3.1x3.1mm, Pitch 0.65mm, Thermal Pad 1.89x1.57mm, IPC High Density)
footprint TI-DGN8-1760X1425TP_M (SOP, 8-Leads, Body 3.1x3.1mm, Pitch 0.65mm, Thermal Pad 1.89x1.57mm, IPC Low Density)
pins: 1 VO1 (out) "VO1 is the audio output for channel 1.", 2 IN1- (in) "IN1- is the inverting input for channel 1.", 3 BYPASS "Tap to voltage divider for internal mid-supply bias supply. Connect to a 0.1 uF to 1 uF low ESR capacitor for best performance.", 4 GND (power) "GND is the ground connection.", 5 SHUTDOWN (in) "Puts the device in a low quiescent current mode when held high", 6 IN2- (in) "IN2- is the inverting input for channel 2.", 7 VO2 (out) "VO2 is the audio output for channel 2.", 8 VDD (power) "VDD is the supply voltage terminal.", 9 EP

## TPA6111A2DGNR
designator U?
150-mW Stereo Headphone Audio Amplifier, Pin Compatible with LM4880 and LM4881, -40 to 85 degC, 8-pin SOP (DGN8), Green (RoHS & no Sb/Br); Manufacturer: Texas Instruments; PartNumber: TPA6111A2DGNR; ISD(uA): 1; Load(Min)(ohms): 16; Output Power(W): 0.15; PSRR(dB): 70; SubFamily: Headphone Amplifier; Supply Max(Max)(Volt): 5.5; Supply Min(Min)(Volt): 2.5; DatasheetVersion: SLOS313B; PackageVersion: 4073271/F, 05/2011; PackageReference: DGN8-1760X1425TP; PackageDescription: 8-Pin Plastic Small Outline, Body 3 x 3 mm, Pitch 0.65 mm; Supplier 1: Digi-Key; Supplier Part Number 1: TPA6111A2DGNR-ND; Supplier 2: Newark; Supplier Part Number 2: 76C9846; Supplier 3: Mouser; Supplier Part Number 3: 595-TPA6111A2DGNR; Eco-Plan: Green (RoHS & no Sb/Br); Headphone Channels: Stereo; Mounting Technology: Surface Mount; Code_JEDEC: MO-187; ComponentLink1Description: Manufacturer URL; ComponentLink1URL: http://www.ti.com/; ComponentLink2Description: Datasheet; ComponentLink2URL: http://www.ti.com/general/docs/lit/getliterature.tsp?genericPartNumber=TPA6111A2&fileType=pdf; ComponentLink3Description: Package Specification; ComponentLink3URL: http://www.ti.com/litv/pdf/mpds046e
footprint TI-DGN8-1760X1425TP_N (SOP, 8-Leads, Body 3.1x3.1mm, Pitch 0.65mm, Thermal Pad 1.89x1.57mm, IPC Medium Density)
footprint TI-DGN8-1760X1425TP_L (SOP, 8-Leads, Body 3.1x3.1mm, Pitch 0.65mm, Thermal Pad 1.89x1.57mm, IPC High Density)
footprint TI-DGN8-1760X1425TP_M (SOP, 8-Leads, Body 3.1x3.1mm, Pitch 0.65mm, Thermal Pad 1.89x1.57mm, IPC Low Density)
pins: 1 VO1 (out) "VO1 is the audio output for channel 1.", 2 IN1- (in) "IN1- is the inverting input for channel 1.", 3 BYPASS "Tap to voltage divider for internal mid-supply bias supply. Connect to a 0.1 uF to 1 uF low ESR capacitor for best performance.", 4 GND (power) "GND is the ground connection.", 5 SHUTDOWN (in) "Puts the device in a low quiescent current mode when held high", 6 IN2- (in) "IN2- is the inverting input for channel 2.", 7 VO2 (out) "VO2 is the audio output for channel 2.", 8 VDD (power) "VDD is the supply voltage terminal.", 9 EP

## TPA6111A2DGNRG4
designator U?
150-mW Stereo Headphone Audio Amplifier, Pin Compatible with LM4880 and LM4881, -40 to 85 degC, 8-pin SOP (DGN8), Green (RoHS & no Sb/Br); Manufacturer: Texas Instruments; PartNumber: TPA6111A2DGNRG4; ISD(uA): 1; Load(Min)(ohms): 16; Output Power(W): 0.15; PSRR(dB): 70; SubFamily: Headphone Amplifier; Supply Max(Max)(Volt): 5.5; Supply Min(Min)(Volt): 2.5; DatasheetVersion: SLOS313B; PackageVersion: 4073271/F, 05/2011; PackageReference: DGN8-1760X1425TP; PackageDescription: 8-Pin Plastic Small Outline, Body 3 x 3 mm, Pitch 0.65 mm; Supplier 1: Digi-Key; Supplier Part Number 1: TPA6111A2DGNRG4-ND; Supplier 2: Mouser; Supplier Part Number 2: 595-TPA6111A2DGNRG4; Eco-Plan: Green (RoHS & no Sb/Br); Headphone Channels: Stereo; Mounting Technology: Surface Mount; Code_JEDEC: MO-187; ComponentLink1Description: Manufacturer URL; ComponentLink1URL: http://www.ti.com/; ComponentLink2Description: Datasheet; ComponentLink2URL: http://www.ti.com/general/docs/lit/getliterature.tsp?genericPartNumber=TPA6111A2&fileType=pdf; ComponentLink3Description: Package Specification; ComponentLink3URL: http://www.ti.com/litv/pdf/mpds046e
footprint TI-DGN8-1760X1425TP_N (SOP, 8-Leads, Body 3.1x3.1mm, Pitch 0.65mm, Thermal Pad 1.89x1.57mm, IPC Medium Density)
footprint TI-DGN8-1760X1425TP_L (SOP, 8-Leads, Body 3.1x3.1mm, Pitch 0.65mm, Thermal Pad 1.89x1.57mm, IPC High Density)
footprint TI-DGN8-1760X1425TP_M (SOP, 8-Leads, Body 3.1x3.1mm, Pitch 0.65mm, Thermal Pad 1.89x1.57mm, IPC Low Density)
pins: 1 VO1 (out) "VO1 is the audio output for channel 1.", 2 IN1- (in) "IN1- is the inverting input for channel 1.", 3 BYPASS "Tap to voltage divider for internal mid-supply bias supply. Connect to a 0.1 uF to 1 uF low ESR capacitor for best performance.", 4 GND (power) "GND is the ground connection.", 5 SHUTDOWN (in) "Puts the device in a low quiescent current mode when held high", 6 IN2- (in) "IN2- is the inverting input for channel 2.", 7 VO2 (out) "VO2 is the audio output for channel 2.", 8 VDD (power) "VDD is the supply voltage terminal.", 9 EP

## TPA6111A2DR
designator U?
150-mW Stereo Headphone Audio Amplifier, Pin Compatible with LM4880 and LM4881, -40 to 85 degC, 8-pin SOIC (D8), Green (RoHS & no Sb/Br); Manufacturer: Texas Instruments; PartNumber: TPA6111A2DR; ISD(uA): 1; Load(Min)(ohms): 16; Output Power(W): 0.15; PSRR(dB): 70; SubFamily: Headphone Amplifier; Supply Max(Max)(Volt): 5.5; Supply Min(Min)(Volt): 2.5; DatasheetVersion: SLOS313B; PackageVersion: 4040047-3/M, 06/2011; PackageReference: D8; PackageDescription: 8-Pin Plastic Small Outline, Body 4.9 x 3.9 mm, Pitch 1.27 mm; Supplier 1: Digi-Key; Supplier Part Number 1: 296-10846-2-ND; Supplier 2: Digi-Key; Supplier Part Number 2: 296-10846-1-ND; Supplier 3: Digi-Key; Supplier Part Number 3: 296-10846-6-ND; Supplier 4: Newark; Supplier Part Number 4: 86W6773; Supplier 5: Newark; Supplier Part Number 5: 76C9847; Supplier 6: Mouser; Supplier Part Number 6: 595-TPA6111A2DR; Eco-Plan: Green (RoHS & no Sb/Br); Headphone Channels: Stereo; Mounting Technology: Surface Mount; Code_JEDEC: MS-012; ComponentLink1Description: Manufacturer URL; ComponentLink1URL: http://www.ti.com/; ComponentLink2Description: Datasheet; ComponentLink2URL: http://www.ti.com/general/docs/lit/getliterature.tsp?genericPartNumber=TPA6111A2&fileType=pdf; ComponentLink3Description: Package Specification; ComponentLink3URL: http://www.ti.com/litv/pdf/msoi002j
footprint TI-D8_N (SOIC, 8-Leads, Body 5x4mm, Pitch 1.27mm, IPC Medium Density)
footprint TI-D8_L (SOIC, 8-Leads, Body 5x4mm, Pitch 1.27mm, IPC High Density)
footprint TI-D8_M (SOIC, 8-Leads, Body 5x4mm, Pitch 1.27mm, IPC Low Density)
pins: 1 VO1 (out) "VO1 is the audio output for channel 1.", 2 IN1- (in) "IN1- is the inverting input for channel 1.", 3 BYPASS "Tap to voltage divider for internal mid-supply bias supply. Connect to a 0.1 uF to 1 uF low ESR capacitor for best performance.", 4 GND (power) "GND is the ground connection.", 5 SHUTDOWN (in) "Puts the device in a low quiescent current mode when held high", 6 IN2- (in) "IN2- is the inverting input for channel 2.", 7 VO2 (out) "VO2 is the audio output for channel 2.", 8 VDD (power) "VDD is the supply voltage terminal."